# Altium footprint library 我的元件库02.PcbLib: 300 footprints (part 17 of 19)
Each footprint in its own frame and in the unit in brackets; x right, y up, seen from the top. Pads: shape width x height; smd on the part's side, far side on the other; paste and mask are expansions set on the pad; w line width, h text height; cw(c..) or ccw(c..) is an arc to the next point about the centre after c.
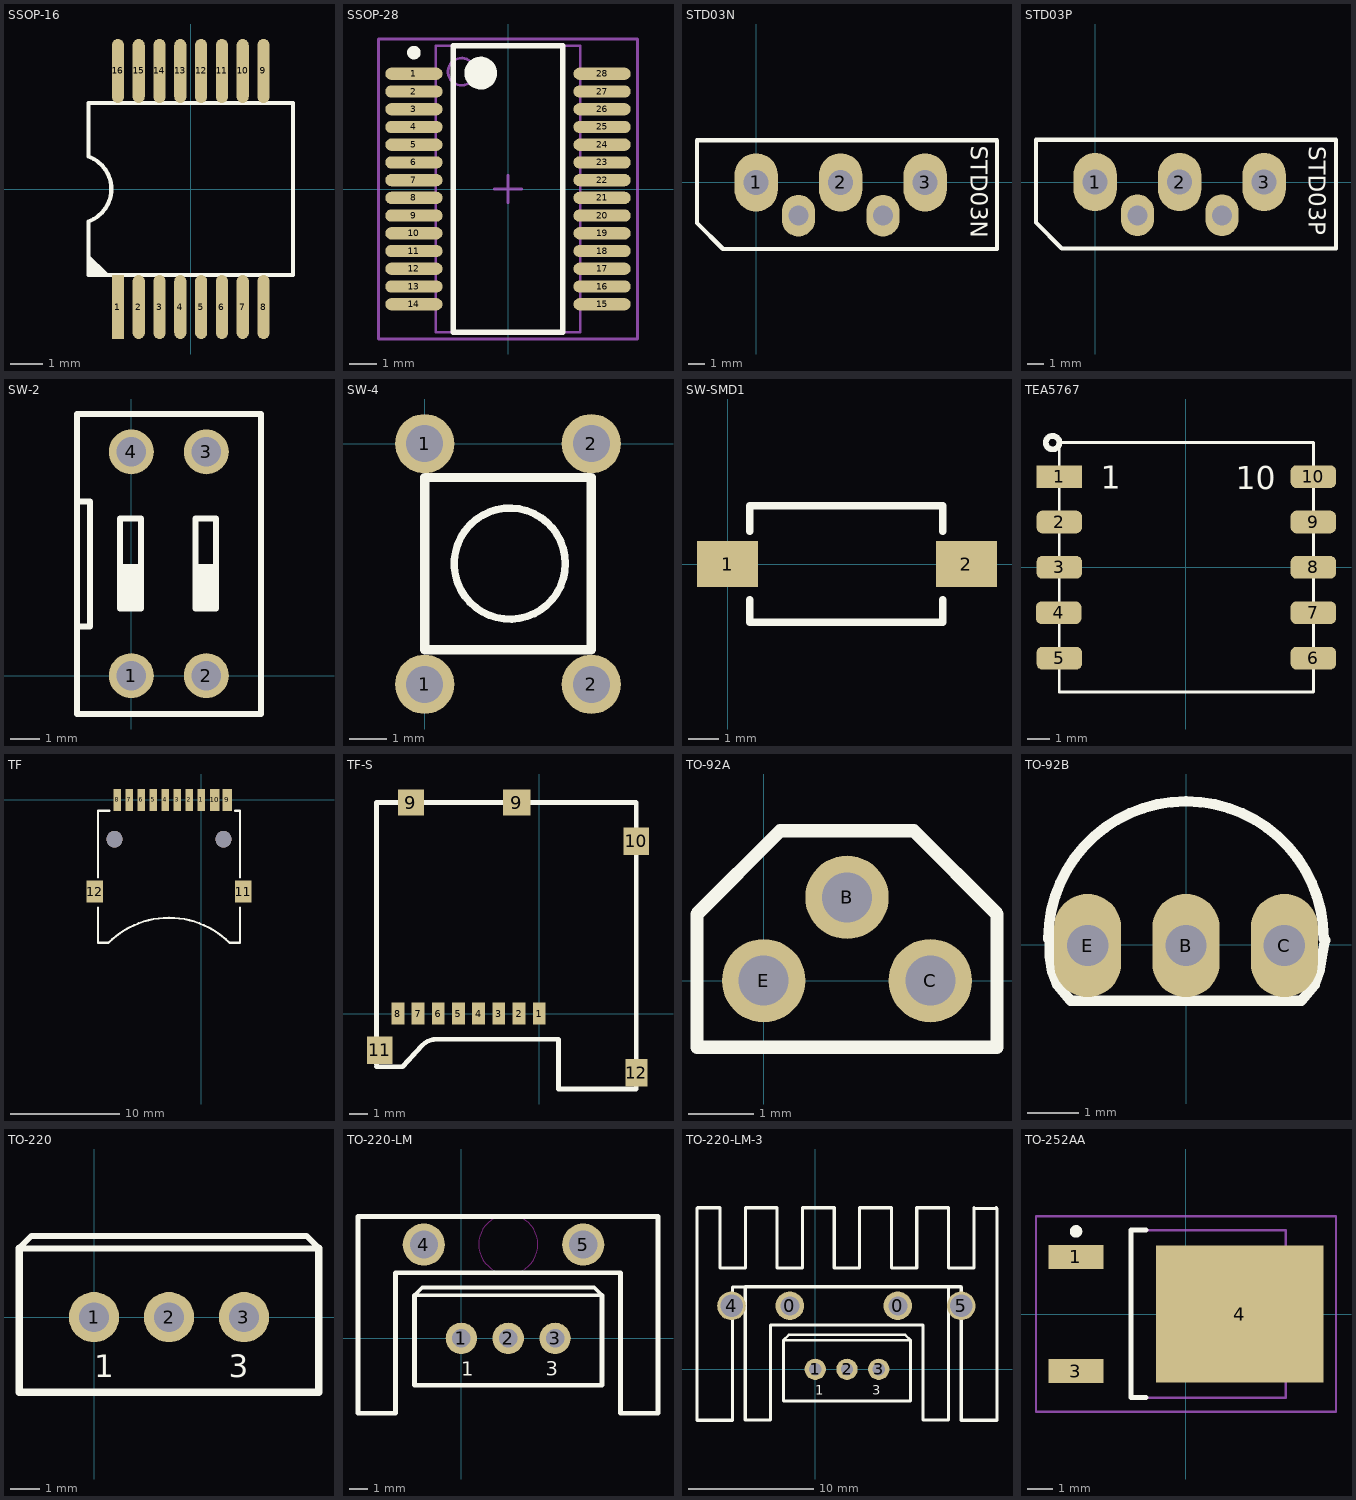
[diagram p16: the footprints below, top view; thin cyan lines are the x and y axes]

## SSOP-16 [mm]
height 2
pads (16):
  rect 0.38x2 smd: 1(-2.274,-3.688)
  oval 0.38x2 smd: 2(-1.625,-3.688) 3(-0.974,-3.688) 4(-0.325,-3.688) 5(0.326,-3.688) 6(0.975,-3.688) 7(1.626,-3.688) 8(2.275,-3.688) 9(2.275,3.688) 10(1.625,3.688) 11(0.975,3.688) 12(0.325,3.688) 13(-0.325,3.688) 14(-0.975,3.688) 15(-1.625,3.688) 16(-2.275,3.688)
Top Overlay:
  region: -3.2,-2.688 -3.2,-2.032 -2.593,-2.63 -2.569,-2.688 -2.576,-2.688
  lines w0.127: 3.2,-2.688 -3.2,-2.688 -3.2,-1.016 ccw(c-3.556,0) -3.2,1.016 -3.2,2.692 3.2,2.692 3.2,-2.662

## SSOP-28 [mm] "SOP, 28-Leads, Body 10.5x5.3mm (max), Pitch 0.65mm, IPC Medium Density"
height 2
pads (28):
  oval 2.1x0.45 smd: 1(-3.45,4.225) 2(-3.45,3.575) 3(-3.45,2.925) 4(-3.45,2.275) 5(-3.45,1.625) 6(-3.45,0.975) 7(-3.45,0.325) 8(-3.45,-0.325) 9(-3.45,-0.975) 10(-3.45,-1.625) 11(-3.45,-2.275) 12(-3.45,-2.925) 13(-3.45,-3.575) 14(-3.45,-4.225) 15(3.45,-4.225) 16(3.45,-3.575) 17(3.45,-2.925) 18(3.45,-2.275) 19(3.45,-1.625) 20(3.45,-0.975) 21(3.45,-0.325) 22(3.45,0.325) 23(3.45,0.975) 24(3.45,1.625) 25(3.45,2.275) 26(3.45,2.925) 27(3.45,3.575) 28(3.45,4.225)
Top Overlay:
  circle w0.25: c-3.45,5 r0.125
  circle w0.6: c-1,4.25 r0.3
  lines w0.2: -2,-5.25 -2,5.25 2,5.25 2,-5.25 -2,-5.25
Mechanical 13:
  circle w0.1: c-1.7,4.3 r0.5
  lines w0.1: -2.65,-5.25 -2.65,5.25 2.65,5.25 2.65,-5.25 -2.65,-5.25
Mechanical 15:
  lines w0.1: -0.5,0 0.5,0 ; 0,-0.5 0,0.5 ; -4.75,-5.5 -4.75,5.5 4.75,5.5 4.75,-5.5 -4.75,-5.5
3D body: height 2, standoff 0.25, extent -2.65,-5.25 2.65,5.25

## STD03N [mm]
pads (5):
  oval 2.6x3.5 hole 1.5: 1(0,0) 2(5.08,0) 3(10.16,0)
  oval 2x2.5 hole 1.2: ""(2.54,-2) ""(7.62,-2)
Top Overlay:
  lines w0.254: -3.556,-2.438 -2.007,-3.988 ; -3.556,2.54 14.351,2.54 ; -3.55,-2.438 -3.55,2.534 14.478,2.534 14.478,-4 -2,-4
  text "STD03N" at 12.903,2.21 h1
Bottom Overlay:
  lines w0.254: -3.556,-2.438 -2.007,-3.988 ; -3.556,2.541 14.351,2.541 ; -3.55,-2.438 -3.55,2.535 ; -2,-4 14.478,-4 ; 14.478,2.535 14.478,2.541
3D body: height 30.15, standoff -9.1, extent -2.82,-2.261 12.93,2.889

## STD03P [mm]
pads (5):
  oval 2.6x3.5 hole 1.5: 1(0,0) 2(5.08,0) 3(10.16,0)
  oval 2x2.5 hole 1.2: ""(2.54,-2) ""(7.62,-2)
Top Overlay:
  lines w0.254: -3.556,-2.438 -2.007,-3.988 ; -3.556,2.54 14.351,2.54 ; -3.55,-2.438 -3.55,2.534 14.478,2.534 14.478,-4 -2,-4
  text "STD03P" at 12.827,2.159 h1

## SW-2 [mil]
pads (4):
  round 60 hole 39.37: 1(0,0) 2(100,0) 3(100,298.43) 4(0,298.43)
Top Overlay:
  rectangle: 85.63,89.57 113.19,148.62
  rectangle: -14.76,89.57 12.79,148.62
  lines w7.87: -72.44,65.51 -72.44,232.28 ; -72.44,232.28 -55.12,232.28 -55.12,65.35 -72.6,65.35 -72.6,-51.18 173.23,-51.18 173.23,348.82 173.07,348.66 -72.44,348.66 -72.44,232.28 ; -14.76,89.57 -14.76,209.65 12.79,209.65 12.79,89.57 -14.76,89.57 ; 85.63,89.57 85.63,209.65 113.19,209.65 113.19,89.57 85.63,89.57

## SW-4 [mm]
pads (4):
  round 1.6 hole 1: 1(0,-6.5) 1(0,0) 2(4.5,-6.5) 2(4.5,0)
Top Overlay:
  circle w0.2: c2.299,-3.24 r1.5
  lines w0.254: 0,-5.565 4.5,-5.565 4.5,-0.915 0,-0.915 0,-5.565

## SW-SMD1 [mm]
pads (2):
  rect 2x1.5 smd: 1(0,0) 2(7.8,0)
Top Overlay:
  lines w0.254: 0.725,-1.168 0.725,-1.9 7.025,-1.9 7.025,-1.168 ; 0.725,1.067 0.725,1.9 7.025,1.9 7.025,1.067
3D body: height 2.5, standoff 0, extent -0.059,-1.945 7.831,1.905

## TEA5767 [mm]
pads (10):
  rect 2x1 smd: 1(-5.587,4)
  rrect50% 2x1 smd: 2(-5.587,2) 3(-5.587,0) 4(-5.613,-2) 5(-5.587,-4) 6(5.613,-4) 7(5.613,-2) 8(5.613,0) 9(5.613,2) 10(5.613,4)
Top Overlay:
  circle w0.254: c-5.885,5.5 r0.297
  lines w0.127: -5.587,-5.5 5.613,-5.5 5.613,5.5 -5.587,5.5 -5.587,-5.5
  text "10" at 2.185,3.441 h1.02
  text "1" at -3.758,3.466 h1.02

## TF [mm]
pads (12):
  rect 0.7x2 smd: 1(0,0) 2(-1.1,0) 3(-2.2,0) 4(-3.3,0) 5(-4.4,0) 6(-5.5,0) 7(-6.6,0) 8(-7.7,0)
  rect 0.85x2 smd: 9(2.4,0) 10(1.25,0)
  rect 1.5x2 smd: 11(3.87,-8.4) 12(-9.77,-8.4)
via -7.95,-3.6 diameter 1.5 hole 1.5
via 2.05,-3.6 diameter 1.5 hole 1.5
Top Overlay:
  lines w0.2: -9.465,-9.872 -9.465,-13.1 -8.5,-13.1 cw(c-2.95,-18.65) 2.6,-13.1 3.565,-13.1 3.565,-9.872 ; -9.465,-7.103 -9.465,-1 -8.417,-1 ; 3.108,-1 3.565,-1 3.565,-7.103

## TF-S [mm]
pads (13):
  rect 0.7x1.2 smd: 1(0,0) 2(-1.1,0) 3(-2.2,0) 4(-3.3,0) 5(-4.4,0) 6(-5.5,0) 7(-6.6,0) 8(-7.7,0)
  rect 1.4x1.4 smd: 9(-6.99,11.5)
  rect 1.48x1.4 smd: 9(-1.22,11.5)
  rect 1.4x1.5 smd: 10(5.3,9.379) 11(-8.7,-2)
  rect 1.2x1.5 smd: 12(5.3,-3.23)
Top Overlay:
  lines w0.254: -8.868,-2.9 -8.106,-2.9 -7.452,-2.9 -6.38,-1.728 ; -8.868,-2.8 -8.868,11.5 5.3,11.5 5.3,-4.115 1.051,-4.115 1.051,-1.406 -5.582,-1.406 ; -6.4,-1.748 -6.38,-1.728 ; -5.588,-1.4 ccw(c-5.588,-2.52) -6.38,-1.728

## TO-92A [mil] "7805/7809/LP2950电源芯片（已加焊）"
pads (3):
  round 50 hole 30: B(50,50) C(100,0) E(0,0)
Top Overlay:
  lines w8: -40,-40 -40,40 10,90 90,90 140,40 140,-40 -40,-40
3D body: height 298, standoff -89.4, extent -38.78,-37.8 139.17,96.06

## TO-92B [mm]
pads (3):
  oval 1.3x2 hole 0.8: B(0,-0.011) C(1.905,-0.011) E(-1.905,-0.011)
Top Overlay:
  lines w0.203: -2.667,0.116 cw(c0,0.116) 2.667,0.116 ; -2.642,0.141 -2.642,-0.214 -2.591,-0.519 -2.49,-0.773 -2.236,-1.078 2.235,-1.078 2.489,-0.773 2.59,-0.468 2.641,-0.164 2.692,0.09
3D body: height 8, standoff 3, extent -2.6,-1.668 2.601,2.601

## TO-220 [mm]
pads (3):
  round 1.7 hole 1: 1(0,0) 2(2.54,0) 3(5.08,0)
Top Overlay:
  lines w0.2: -2.54,2.328 7.62,2.328 7.197,2.752 -2.117,2.752 -2.54,2.328
  lines w0.254: -2.54,2.328 -2.54,-2.529 -2.529,-2.54 7.609,-2.54 7.62,-2.529 7.62,2.328
  text "3" at 4.572,-2.032 h0.76
  text "1" at 0,-2.032 h0.76
3D body: height 18.8, standoff -9.98, extent -2.385,-2.108 7.515,2.392

## TO-220-LM [mm]
pads (5):
  round 1.7 hole 1: 1(0,0) 2(2.54,0) 3(5.08,0)
  round 2.286 hole 1.524: 4(-2.032,5.08) 5(6.604,5.08)
Top Overlay:
  lines w0.2: -2.54,2.328 -2.117,2.752 7.197,2.752 7.62,2.328 -2.54,2.328
  lines w0.254: -2.54,2.328 -2.54,-2.529 -2.529,-2.54 7.609,-2.54 7.62,-2.529 7.62,2.328 ; 10.657,3.556 10.657,6.604 ; 10.657,6.604 -5.599,6.604 -5.599,3.556 -5.599,1.016 -5.599,-4.064 -3.567,-4.064 -3.567,3.556 8.625,3.556 8.625,-4.064 10.657,-4.064 10.657,6.604
  text "1" at 0,-2.032 h0.76
  text "3" at 4.572,-2.032 h0.76
Keep-Out Layer:
  circle w0.025: c2.545,5.094 r1.606
3D body: height 21.07, standoff -4.86, extent -5.96,-5.775 11.04,4.445

## TO-220-LM-3 [mil]
height 1181.1
pads (7):
  round 90 hole 60: 0(-80,200) 0(260,200)
  round 66.93 hole 39.37: 1(0,0) 2(100,0) 3(200,0)
  round 90 hole 70.87: 4(-263.72,199.65) 5(459.82,199.65)
Top Overlay:
  lines w7.87: -100,91.67 -83.33,108.33 283.33,108.33 300,91.67 -100,91.67
  lines w10: -372.44,379.39 -372.44,507.14 ; -372.44,391.91 -372.44,507.14 ; -100,91.67 -100,-99.56 -99.56,-100 299.56,-100 300,-99.56 300,91.67 ; 419.56,140 419.56,260 ; 459.82,119.65 459.82,199.65 ; 570.28,508.93 572.44,506.77 ; 572.44,387.75 572.44,506.77 ; -372.44,507.14 -372.44,-160.61 -260.18,-160.61 -260.18,259.65 -220.78,259.65 -220.44,260 ; -372.44,507.14 -370.65,508.93 -300.18,508.93 -300.18,319.39 -220.18,319.39 -220.18,508.93 -120.18,508.93 -120.18,319.39 -40.18,319.39 -40.18,508.93 59.82,508.93 59.82,319.39 139.82,319.39 139.82,508.93 239.82,508.93 239.82,319.39 319.82,319.39 319.82,508.93 399.82,508.93 419.82,508.93 419.82,319.39 499.82,319.39 499.82,508.93 501.97,506.77 572.44,506.77 ; -220.44,260 419.56,260 ; -220.44,260 -220.44,140 -220.44,40 -220.44,-160 -140.44,-160 -140.44,140 339.56,140 339.56,-160 419.56,-160 419.56,260 ; 419.56,260 459.47,260 459.82,259.65 459.82,-160.61 572.44,-160.61 572.44,506.77
  text "1" at 0,-80 h30
  text "3" at 180,-80 h30

## TO-252AA [mm] "D-PAK, 4-Leads, Body 6.1x6.5mm, Pitch 2.28mm, Lead Span 9.8mm, IPC Low Density"
height 2.38
pads (3):
  rect 2.2x0.95 smd: 1(-4.4,2.28) 3(-4.4,-2.28)
  rect 6.7x5.5 smd: 4(2.15,0)
Top Overlay:
  circle w0.25: c-4.4,3.305 r0.125
  lines w0.2: -1.6,-3.35 -2.2,-3.35 -2.2,3.35 -1.6,3.35
Mechanical 13:
  lines w0.1: -2.2,-3.35 4,-3.35 4,3.35 -2.2,3.35 -2.2,-3.35
Mechanical 15:
  lines w0.1: -0.5,0 0.5,0 ; 0,-0.5 0,0.5 ; -6,-3.9 6,-3.9 6,3.9 -6,3.9 -6,-3.9
3D body: height 2.39, standoff -0.02, extent -4.9,-3.27 5.038,3.27